# Altium footprint library connectors_socets.pcblib: 601 footprints (part 24 of 38)
Each footprint in its own frame and in the unit in brackets; x right, y up, seen from the top. Pads: shape width x height; smd on the part's side, far side on the other; paste and mask are expansions set on the pad; w line width, h text height; cw(c..) or ccw(c..) is an arc to the next point about the centre after c.
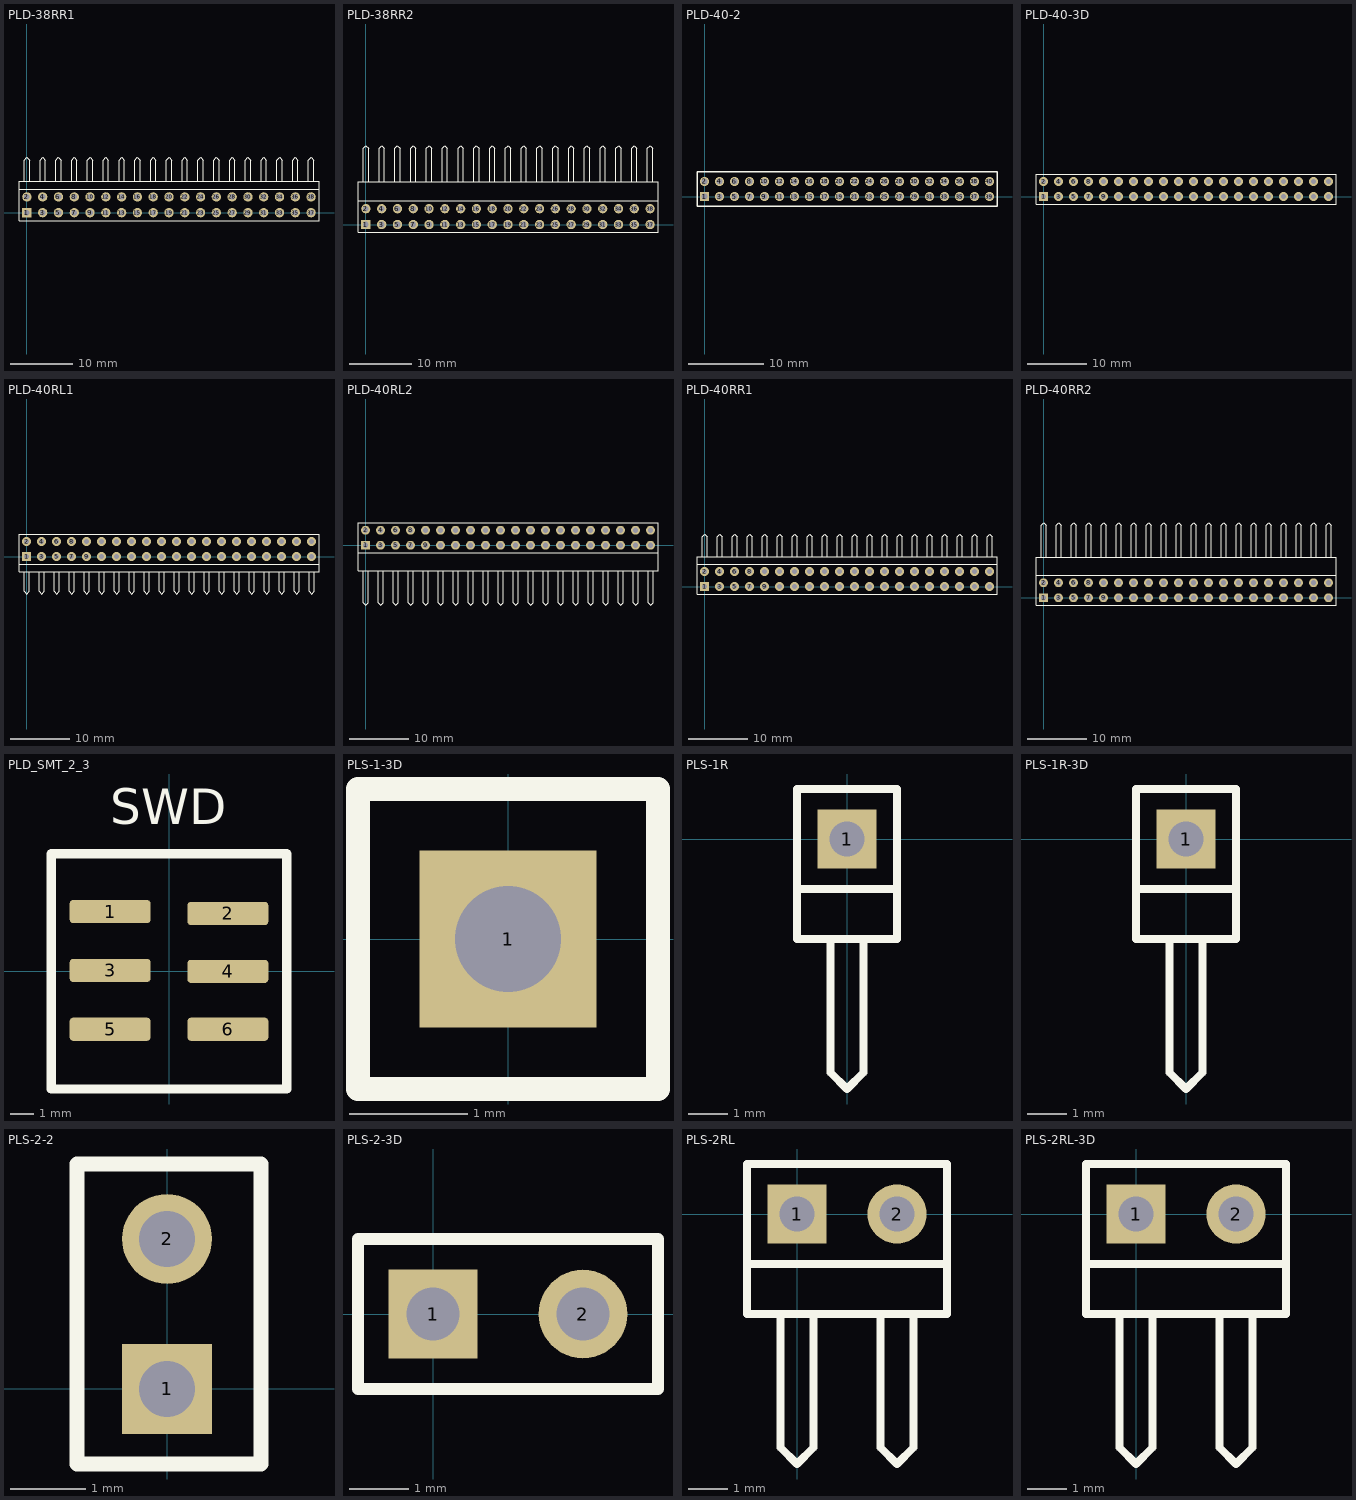
[diagram p23: the footprints below, top view; thin cyan lines are the x and y axes]

## PLD-38RR1 [mm] "Connector; Header; 19x2 Position"
height 7
pads (38):
  rect 1.5x1.5 hole 0.9: 1(0,0)
  round 1.5 hole 0.9: 2(0,2.54) 3(2.54,0) 4(2.54,2.54) 5(5.08,0) 6(5.08,2.54) 7(7.62,0) 8(7.62,2.54) 9(10.16,0) 10(10.16,2.54) 11(12.7,0) 12(12.7,2.54) 13(15.24,0) 14(15.24,2.54) 15(17.78,0) 16(17.78,2.54) 17(20.32,0) 18(20.32,2.54) 19(22.86,0) 20(22.86,2.54) 21(25.4,0) 22(25.4,2.54) 23(27.94,0) 24(27.94,2.54) 25(30.48,0) 26(30.48,2.54) 27(33.02,0) 28(33.02,2.54) 29(35.56,0) 30(35.56,2.54) 31(38.1,0) 32(38.1,2.54) 33(40.64,0) 34(40.64,2.54) 35(43.18,0) 36(43.18,2.54) 37(45.72,0) 38(45.72,2.54)
Top Overlay:
  lines w0.2: -0.423,5.08 -0.423,8.467 0,8.89 0.423,8.467 0.423,5.08 ; 2.117,5.08 2.117,8.467 2.54,8.89 2.963,8.467 2.963,5.08 ; 4.657,5.08 4.657,8.467 5.08,8.89 5.503,8.467 5.503,5.08 ; 7.197,5.08 7.197,8.467 7.62,8.89 8.043,8.467 8.043,5.08 ; 9.737,5.08 9.737,8.467 10.16,8.89 10.583,8.467 10.583,5.08 ; 12.277,5.08 12.277,8.467 12.7,8.89 13.123,8.467 13.123,5.08 ; 14.817,5.08 14.817,8.467 15.24,8.89 15.663,8.467 15.663,5.08 ; 17.357,5.08 17.357,8.467 17.78,8.89 18.203,8.467 18.203,5.08 ; 19.897,5.08 19.897,8.467 20.32,8.89 20.743,8.467 20.743,5.08 ; 22.437,5.08 22.437,8.467 22.86,8.89 23.283,8.467 23.283,5.08 ; 24.977,5.08 24.977,8.467 25.4,8.89 25.823,8.467 25.823,5.08 ; 27.517,5.08 27.517,8.467 27.94,8.89 28.363,8.467 28.363,5.08 ; 30.057,5.08 30.057,8.467 30.48,8.89 30.903,8.467 30.903,5.08 ; 32.597,5.08 32.597,8.467 33.02,8.89 33.443,8.467 33.443,5.08 ; 35.137,5.08 35.137,8.467 35.56,8.89 35.983,8.467 35.983,5.08 ; 37.677,5.08 37.677,8.467 38.1,8.89 38.523,8.467 38.523,5.08 ; 40.217,5.08 40.217,8.467 40.64,8.89 41.063,8.467 41.063,5.08 ; 42.757,5.08 42.757,8.467 43.18,8.89 43.603,8.467 43.603,5.08 ; 45.297,5.08 45.297,8.467 45.72,8.89 46.143,8.467 46.143,5.08 ; -1.27,3.81 46.99,3.81 ; -1.27,3.81 -1.27,-1.27 46.99,-1.27 46.99,3.81 ; -1.27,3.81 -1.27,5.08 46.99,5.08 46.99,3.81
3D body "PLS-1Rr.stp": height 7.99, standoff -3, extent 44.45,-1.27 46.99,9.89
3D body "PLS-1R.step": height 5.45, standoff -3, extent 44.45,1.27 46.99,9.89
3D body "PLS-1R.step": height 5.45, standoff -3, extent 1.27,1.27 3.81,9.89
3D body "PLS-1Rr.stp": height 7.99, standoff -3, extent 1.27,-1.27 3.81,9.89
3D body "PLS-1Rr.stp": height 7.99, standoff -3, extent -1.27,-1.27 1.27,9.89
3D body "PLS-1R.step": height 5.45, standoff -3, extent -1.27,1.27 1.27,9.89
3D body "PLS-1R.step": height 5.45, standoff -3, extent 6.35,1.27 8.89,9.89
3D body "PLS-1Rr.stp": height 7.99, standoff -3, extent 6.35,-1.27 8.89,9.89
3D body "PLS-1Rr.stp": height 7.99, standoff -3, extent 3.81,-1.27 6.35,9.89
3D body "PLS-1R.step": height 5.45, standoff -3, extent 3.81,1.27 6.35,9.89
3D body "PLS-1R.step": height 5.45, standoff -3, extent 11.43,1.27 13.97,9.89
3D body "PLS-1Rr.stp": height 7.99, standoff -3, extent 11.43,-1.27 13.97,9.89
3D body "PLS-1Rr.stp": height 7.99, standoff -3, extent 8.89,-1.27 11.43,9.89
3D body "PLS-1R.step": height 5.45, standoff -3, extent 8.89,1.27 11.43,9.89
3D body "PLS-1R.step": height 5.45, standoff -3, extent 16.51,1.27 19.05,9.89
3D body "PLS-1Rr.stp": height 7.99, standoff -3, extent 16.51,-1.27 19.05,9.89
3D body "PLS-1Rr.stp": height 7.99, standoff -3, extent 13.97,-1.27 16.51,9.89
3D body "PLS-1R.step": height 5.45, standoff -3, extent 13.97,1.27 16.51,9.89
3D body "PLS-1R.step": height 5.45, standoff -3, extent 21.59,1.27 24.13,9.89
3D body "PLS-1Rr.stp": height 7.99, standoff -3, extent 21.59,-1.27 24.13,9.89
3D body "PLS-1Rr.stp": height 7.99, standoff -3, extent 19.05,-1.27 21.59,9.89
3D body "PLS-1R.step": height 5.45, standoff -3, extent 19.05,1.27 21.59,9.89
3D body "PLS-1R.step": height 5.45, standoff -3, extent 26.67,1.27 29.21,9.89
3D body "PLS-1Rr.stp": height 7.99, standoff -3, extent 26.67,-1.27 29.21,9.89
3D body "PLS-1Rr.stp": height 7.99, standoff -3, extent 24.13,-1.27 26.67,9.89
3D body "PLS-1R.step": height 5.45, standoff -3, extent 24.13,1.27 26.67,9.89
3D body "PLS-1R.step": height 5.45, standoff -3, extent 31.75,1.27 34.29,9.89
3D body "PLS-1Rr.stp": height 7.99, standoff -3, extent 31.75,-1.27 34.29,9.89
3D body "PLS-1Rr.stp": height 7.99, standoff -3, extent 29.21,-1.27 31.75,9.89
3D body "PLS-1R.step": height 5.45, standoff -3, extent 29.21,1.27 31.75,9.89
3D body "PLS-1R.step": height 5.45, standoff -3, extent 36.83,1.27 39.37,9.89
3D body "PLS-1Rr.stp": height 7.99, standoff -3, extent 36.83,-1.27 39.37,9.89
3D body "PLS-1Rr.stp": height 7.99, standoff -3, extent 34.29,-1.27 36.83,9.89
3D body "PLS-1R.step": height 5.45, standoff -3, extent 34.29,1.27 36.83,9.89
3D body "PLS-1R.step": height 5.45, standoff -3, extent 41.91,1.27 44.45,9.89
3D body "PLS-1Rr.stp": height 7.99, standoff -3, extent 41.91,-1.27 44.45,9.89
3D body "PLS-1Rr.stp": height 7.99, standoff -3, extent 39.37,-1.27 41.91,9.89
3D body "PLS-1R.step": height 5.45, standoff -3, extent 39.37,1.27 41.91,9.89

## PLD-38RR2 [mm] "Connector; Header; 19x2 Position"
height 5
pads (38):
  rect 1.5x1.5 hole 0.9: 1(0,0)
  round 1.5 hole 0.9: 2(0,2.54) 3(2.54,0) 4(2.54,2.54) 5(5.08,0) 6(5.08,2.54) 7(7.62,0) 8(7.62,2.54) 9(10.16,0) 10(10.16,2.54) 11(12.7,0) 12(12.7,2.54) 13(15.24,0) 14(15.24,2.54) 15(17.78,0) 16(17.78,2.54) 17(20.32,0) 18(20.32,2.54) 19(22.86,0) 20(22.86,2.54) 21(25.4,0) 22(25.4,2.54) 23(27.94,0) 24(27.94,2.54) 25(30.48,0) 26(30.48,2.54) 27(33.02,0) 28(33.02,2.54) 29(35.56,0) 30(35.56,2.54) 31(38.1,0) 32(38.1,2.54) 33(40.64,0) 34(40.64,2.54) 35(43.18,0) 36(43.18,2.54) 37(45.72,0) 38(45.72,2.54)
Top Overlay:
  lines w0.2: -0.423,6.858 -0.423,12.277 0,12.7 0.423,12.277 0.423,6.858 ; 2.117,6.858 2.117,12.277 2.54,12.7 2.963,12.277 2.963,6.858 ; 4.657,6.858 4.657,12.277 5.08,12.7 5.503,12.277 5.503,6.858 ; 7.197,6.858 7.197,12.277 7.62,12.7 8.043,12.277 8.043,6.858 ; 9.737,6.858 9.737,12.277 10.16,12.7 10.583,12.277 10.583,6.858 ; 12.277,6.858 12.277,12.277 12.7,12.7 13.123,12.277 13.123,6.858 ; 14.817,6.858 14.817,12.277 15.24,12.7 15.663,12.277 15.663,6.858 ; 17.357,6.858 17.357,12.277 17.78,12.7 18.203,12.277 18.203,6.858 ; 19.897,6.858 19.897,12.277 20.32,12.7 20.743,12.277 20.743,6.858 ; 22.437,6.858 22.437,12.277 22.86,12.7 23.283,12.277 23.283,6.858 ; 24.977,6.858 24.977,12.277 25.4,12.7 25.823,12.277 25.823,6.858 ; 27.517,6.858 27.517,12.277 27.94,12.7 28.363,12.277 28.363,6.858 ; 30.057,6.858 30.057,12.277 30.48,12.7 30.903,12.277 30.903,6.858 ; 32.597,6.858 32.597,12.277 33.02,12.7 33.443,12.277 33.443,6.858 ; 35.137,6.858 35.137,12.277 35.56,12.7 35.983,12.277 35.983,6.858 ; 37.677,6.858 37.677,12.277 38.1,12.7 38.523,12.277 38.523,6.858 ; 40.217,6.858 40.217,12.277 40.64,12.7 41.063,12.277 41.063,6.858 ; 42.757,6.858 42.757,12.277 43.18,12.7 43.603,12.277 43.603,6.858 ; 45.297,6.858 45.297,12.277 45.72,12.7 46.143,12.277 46.143,6.858 ; 46.99,3.81 -1.27,3.81 ; -1.27,3.81 -1.27,-1.27 46.99,-1.27 46.99,6.858 -1.27,6.858 -1.27,3.81
3D body "PLD-R2.stp": height 5.08, standoff -2.6, extent 3.81,-0.324 6.35,12.516
3D body "PLD-R2.stp": height 5.08, standoff -2.6, extent 1.27,-0.324 3.81,12.516
3D body "PLD-R2.stp": height 5.08, standoff -2.6, extent -1.27,-0.324 1.27,12.516
3D body "PLD-R2.stp": height 5.08, standoff -2.6, extent 11.43,-0.324 13.97,12.516
3D body "PLD-R2.stp": height 5.08, standoff -2.6, extent 8.89,-0.324 11.43,12.516
3D body "PLD-R2.stp": height 5.08, standoff -2.6, extent 6.35,-0.324 8.89,12.516
3D body "PLD-R2.stp": height 5.08, standoff -2.6, extent 19.05,-0.324 21.59,12.516
3D body "PLD-R2.stp": height 5.08, standoff -2.6, extent 16.51,-0.324 19.05,12.516
3D body "PLD-R2.stp": height 5.08, standoff -2.6, extent 13.97,-0.324 16.51,12.516
3D body "PLD-R2.stp": height 5.08, standoff -2.6, extent 26.67,-0.324 29.21,12.516
3D body "PLD-R2.stp": height 5.08, standoff -2.6, extent 24.13,-0.324 26.67,12.516
3D body "PLD-R2.stp": height 5.08, standoff -2.6, extent 21.59,-0.324 24.13,12.516
3D body "PLD-R2.stp": height 5.08, standoff -2.6, extent 34.29,-0.324 36.83,12.516
3D body "PLD-R2.stp": height 5.08, standoff -2.6, extent 31.75,-0.324 34.29,12.516
3D body "PLD-R2.stp": height 5.08, standoff -2.6, extent 29.21,-0.324 31.75,12.516
3D body "PLD-R2.stp": height 5.08, standoff -2.6, extent 41.91,-0.324 44.45,12.516
3D body "PLD-R2.stp": height 5.08, standoff -2.6, extent 39.37,-0.324 41.91,12.516
3D body "PLD-R2.stp": height 5.08, standoff -2.6, extent 36.83,-0.324 39.37,12.516
3D body "PLD-R2.stp": height 5.08, standoff -2.6, extent 44.45,-0.324 46.99,12.516

## PLD-40-2 [mm] "Connector; Header; 20x2 Position"
height 6
pads (40):
  rect 1.2x1.2 hole 0.75: 1(0,0)
  round 1.2 hole 0.75: 2(0,2) 3(2,0) 4(2,2) 5(4,0) 6(4,2) 7(6,0) 8(6,2) 9(8,0) 10(8,2) 11(10,0) 12(10,2) 13(12,0) 14(12,2) 15(14,0) 16(14,2) 17(16,0) 18(16,2) 19(18,0) 20(18,2) 21(20,0) 22(20,2) 23(22,0) 24(22,2) 25(24,0) 26(24,2) 27(26,0) 28(26,2) 29(28,0) 30(28,2) 31(30,0) 32(30,2) 33(32,0) 34(32,2) 35(34,0) 36(34,2) 37(36,0) 38(36,2) 39(38,0) 40(38,2)
Top Overlay:
  lines w0.2: -1,-1.3 -1,3.3 39,3.3 39,-1.3 -1,-1.3
3D body "pld-2mm.stp": height 5.5, standoff -2.5, extent 37,-1.3 39,3.3
3D body "pld-2mm.stp": height 5.5, standoff -2.5, extent 35,-1.3 37,3.3
3D body "pld-2mm.stp": height 5.5, standoff -2.5, extent 33,-1.3 35,3.3
3D body "pld-2mm.stp": height 5.5, standoff -2.5, extent 31,-1.3 33,3.3
3D body "pld-2mm.stp": height 5.5, standoff -2.5, extent 29,-1.3 31,3.3
3D body "pld-2mm.stp": height 5.5, standoff -2.5, extent 27,-1.3 29,3.3
3D body "pld-2mm.stp": height 5.5, standoff -2.5, extent 25,-1.3 27,3.3
3D body "pld-2mm.stp": height 5.5, standoff -2.5, extent 23,-1.3 25,3.3
3D body "pld-2mm.stp": height 5.5, standoff -2.5, extent 21,-1.3 23,3.3
3D body "pld-2mm.stp": height 5.5, standoff -2.5, extent 19,-1.3 21,3.3
3D body "pld-2mm.stp": height 5.5, standoff -2.5, extent 17,-1.3 19,3.3
3D body "pld-2mm.stp": height 5.5, standoff -2.5, extent 15,-1.3 17,3.3
3D body "pld-2mm.stp": height 5.5, standoff -2.5, extent 13,-1.3 15,3.3
3D body "pld-2mm.stp": height 5.5, standoff -2.5, extent 11,-1.3 13,3.3
3D body "pld-2mm.stp": height 5.5, standoff -2.5, extent 9,-1.3 11,3.3
3D body "pld-2mm.stp": height 5.5, standoff -2.5, extent 7,-1.3 9,3.3
3D body "pld-2mm.stp": height 5.5, standoff -2.5, extent 5,-1.3 7,3.3
3D body "pld-2mm.stp": height 5.5, standoff -2.5, extent 3,-1.3 5,3.3
3D body "pld-2mm.stp": height 5.5, standoff -2.5, extent 1,-1.3 3,3.3
3D body "pld-2mm.stp": height 5.5, standoff -2.5, extent -1,-1.3 1,3.3

## PLD-40-3D [mm] "Connector; Header; 20x2 Position"
height 7.5
pads (40):
  rect 1.5x1.5 hole 0.9: 1(0,0)
  round 1.5 hole 0.9: 2(0,2.54) 3(2.54,0) 4(2.54,2.54) 5(5.08,0) 6(5.08,2.54) 7(7.62,0) 8(7.62,2.54) 9(10.16,0) 10(10.16,2.54) 11(12.7,0) 12(12.7,2.54) 13(15.24,0) 14(15.24,2.54) 15(17.78,0) 16(17.78,2.54) 17(20.32,0) 18(20.32,2.54) 19(22.86,0) 20(22.86,2.54) 21(25.4,0) 22(25.4,2.54) 23(27.94,0) 24(27.94,2.54) 25(30.48,0) 26(30.48,2.54) 27(33.02,0) 28(33.02,2.54) 29(35.56,0) 30(35.56,2.54) 31(38.1,0) 32(38.1,2.54) 33(40.64,0) 34(40.64,2.54) 35(43.18,0) 36(43.18,2.54) 37(45.72,0) 38(45.72,2.54) 39(48.26,0) 40(48.26,2.54)
Top Overlay:
  lines w0.2: -1.27,-1.27 49.53,-1.27 49.53,3.81 -1.27,3.81 -1.27,-1.27
3D body "PLD-40.step": height 8.4, standoff -3, extent -1.27,-1.23 49.53,3.77

## PLD-40RL1 [mm] "Connector; Header; 20x2 Position"
height 7
pads (40):
  rect 1.5x1.5 hole 0.9: 1(0,0)
  round 1.5 hole 0.9: 2(0,2.54) 3(2.54,0) 4(2.54,2.54) 5(5.08,0) 6(5.08,2.54) 7(7.62,0) 8(7.62,2.54) 9(10.16,0) 10(10.16,2.54) 11(12.7,0) 12(12.7,2.54) 13(15.24,0) 14(15.24,2.54) 15(17.78,0) 16(17.78,2.54) 17(20.32,0) 18(20.32,2.54) 19(22.86,0) 20(22.86,2.54) 21(25.4,0) 22(25.4,2.54) 23(27.94,0) 24(27.94,2.54) 25(30.48,0) 26(30.48,2.54) 27(33.02,0) 28(33.02,2.54) 29(35.56,0) 30(35.56,2.54) 31(38.1,0) 32(38.1,2.54) 33(40.64,0) 34(40.64,2.54) 35(43.18,0) 36(43.18,2.54) 37(45.72,0) 38(45.72,2.54) 39(48.26,0) 40(48.26,2.54)
Top Overlay:
  lines w0.2: -0.423,-2.54 -0.423,-5.927 0,-6.35 0.423,-5.927 0.423,-2.54 ; 2.117,-2.54 2.117,-5.927 2.54,-6.35 2.963,-5.927 2.963,-2.54 ; 4.657,-2.54 4.657,-5.927 5.08,-6.35 5.503,-5.927 5.503,-2.54 ; 7.197,-2.54 7.197,-5.927 7.62,-6.35 8.043,-5.927 8.043,-2.54 ; 9.737,-2.54 9.737,-5.927 10.16,-6.35 10.583,-5.927 10.583,-2.54 ; 12.277,-2.54 12.277,-5.927 12.7,-6.35 13.123,-5.927 13.123,-2.54 ; 14.817,-2.54 14.817,-5.927 15.24,-6.35 15.663,-5.927 15.663,-2.54 ; 17.357,-2.54 17.357,-5.927 17.78,-6.35 18.203,-5.927 18.203,-2.54 ; 19.897,-2.54 19.897,-5.927 20.32,-6.35 20.743,-5.927 20.743,-2.54 ; 22.437,-2.54 22.437,-5.927 22.86,-6.35 23.283,-5.927 23.283,-2.54 ; 24.977,-2.54 24.977,-5.927 25.4,-6.35 25.823,-5.927 25.823,-2.54 ; 27.517,-2.54 27.517,-5.927 27.94,-6.35 28.363,-5.927 28.363,-2.54 ; 30.057,-2.54 30.057,-5.927 30.48,-6.35 30.903,-5.927 30.903,-2.54 ; 32.597,-2.54 32.597,-5.927 33.02,-6.35 33.443,-5.927 33.443,-2.54 ; 35.137,-2.54 35.137,-5.927 35.56,-6.35 35.983,-5.927 35.983,-2.54 ; 37.677,-2.54 37.677,-5.927 38.1,-6.35 38.523,-5.927 38.523,-2.54 ; 40.217,-2.54 40.217,-5.927 40.64,-6.35 41.063,-5.927 41.063,-2.54 ; 42.757,-2.54 42.757,-5.927 43.18,-6.35 43.603,-5.927 43.603,-2.54 ; 45.297,-2.54 45.297,-5.927 45.72,-6.35 46.143,-5.927 46.143,-2.54 ; 47.837,-2.54 47.837,-5.927 48.26,-6.35 48.683,-5.927 48.683,-2.54 ; -1.27,-1.27 49.53,-1.27 ; -1.27,-1.27 -1.27,3.81 49.53,3.81 49.53,-1.27 ; -1.27,-1.27 -1.27,-2.54 49.53,-2.54 49.53,-1.27
3D body "PLS-1R.step": height 5.45, standoff -3, extent 46.99,-7.35 49.53,1.27
3D body "PLS-1Rr.stp": height 7.99, standoff -3, extent 46.99,-7.35 49.53,3.81
3D body "PLS-1Rr.stp": height 7.99, standoff -3, extent 44.45,-7.35 46.99,3.81
3D body "PLS-1R.step": height 5.45, standoff -3, extent 44.45,-7.35 46.99,1.27
3D body "PLS-1R.step": height 5.45, standoff -3, extent 41.91,-7.35 44.45,1.27
3D body "PLS-1Rr.stp": height 7.99, standoff -3, extent 41.91,-7.35 44.45,3.81
3D body "PLS-1Rr.stp": height 7.99, standoff -3, extent 39.37,-7.35 41.91,3.81
3D body "PLS-1R.step": height 5.45, standoff -3, extent 39.37,-7.35 41.91,1.27
3D body "PLS-1R.step": height 5.45, standoff -3, extent 36.83,-7.35 39.37,1.27
3D body "PLS-1Rr.stp": height 7.99, standoff -3, extent 36.83,-7.35 39.37,3.81
3D body "PLS-1Rr.stp": height 7.99, standoff -3, extent 34.29,-7.35 36.83,3.81
3D body "PLS-1R.step": height 5.45, standoff -3, extent 34.29,-7.35 36.83,1.27
3D body "PLS-1R.step": height 5.45, standoff -3, extent 31.75,-7.35 34.29,1.27
3D body "PLS-1Rr.stp": height 7.99, standoff -3, extent 31.75,-7.35 34.29,3.81
3D body "PLS-1Rr.stp": height 7.99, standoff -3, extent 29.21,-7.35 31.75,3.81
3D body "PLS-1R.step": height 5.45, standoff -3, extent 29.21,-7.35 31.75,1.27
3D body "PLS-1R.step": height 5.45, standoff -3, extent 26.67,-7.35 29.21,1.27
3D body "PLS-1Rr.stp": height 7.99, standoff -3, extent 26.67,-7.35 29.21,3.81
3D body "PLS-1Rr.stp": height 7.99, standoff -3, extent 24.13,-7.35 26.67,3.81
3D body "PLS-1R.step": height 5.45, standoff -3, extent 24.13,-7.35 26.67,1.27
3D body "PLS-1R.step": height 5.45, standoff -3, extent 21.59,-7.35 24.13,1.27
3D body "PLS-1Rr.stp": height 7.99, standoff -3, extent 21.59,-7.35 24.13,3.81
3D body "PLS-1Rr.stp": height 7.99, standoff -3, extent 19.05,-7.35 21.59,3.81
3D body "PLS-1R.step": height 5.45, standoff -3, extent 19.05,-7.35 21.59,1.27
3D body "PLS-1R.step": height 5.45, standoff -3, extent 16.51,-7.35 19.05,1.27
3D body "PLS-1Rr.stp": height 7.99, standoff -3, extent 16.51,-7.35 19.05,3.81
3D body "PLS-1Rr.stp": height 7.99, standoff -3, extent 13.97,-7.35 16.51,3.81
3D body "PLS-1R.step": height 5.45, standoff -3, extent 13.97,-7.35 16.51,1.27
3D body "PLS-1R.step": height 5.45, standoff -3, extent 11.43,-7.35 13.97,1.27
3D body "PLS-1Rr.stp": height 7.99, standoff -3, extent 11.43,-7.35 13.97,3.81
3D body "PLS-1Rr.stp": height 7.99, standoff -3, extent 8.89,-7.35 11.43,3.81
3D body "PLS-1R.step": height 5.45, standoff -3, extent 8.89,-7.35 11.43,1.27
3D body "PLS-1R.step": height 5.45, standoff -3, extent 6.35,-7.35 8.89,1.27
3D body "PLS-1Rr.stp": height 7.99, standoff -3, extent 6.35,-7.35 8.89,3.81
3D body "PLS-1Rr.stp": height 7.99, standoff -3, extent 3.81,-7.35 6.35,3.81
3D body "PLS-1R.step": height 5.45, standoff -3, extent 3.81,-7.35 6.35,1.27
3D body "PLS-1R.step": height 5.45, standoff -3, extent 1.27,-7.35 3.81,1.27
3D body "PLS-1Rr.stp": height 7.99, standoff -3, extent 1.27,-7.35 3.81,3.81
3D body "PLS-1Rr.stp": height 7.99, standoff -3, extent -1.27,-7.35 1.27,3.81
3D body "PLS-1R.step": height 5.45, standoff -3, extent -1.27,-7.35 1.27,1.27

## PLD-40RL2 [mm] "Connector; Header; 20x2 Position"
height 5
pads (40):
  rect 1.5x1.5 hole 0.9: 1(0,0)
  round 1.5 hole 0.9: 2(0,2.54) 3(2.54,0) 4(2.54,2.54) 5(5.08,0) 6(5.08,2.54) 7(7.62,0) 8(7.62,2.54) 9(10.16,0) 10(10.16,2.54) 11(12.7,0) 12(12.7,2.54) 13(15.24,0) 14(15.24,2.54) 15(17.78,0) 16(17.78,2.54) 17(20.32,0) 18(20.32,2.54) 19(22.86,0) 20(22.86,2.54) 21(25.4,0) 22(25.4,2.54) 23(27.94,0) 24(27.94,2.54) 25(30.48,0) 26(30.48,2.54) 27(33.02,0) 28(33.02,2.54) 29(35.56,0) 30(35.56,2.54) 31(38.1,0) 32(38.1,2.54) 33(40.64,0) 34(40.64,2.54) 35(43.18,0) 36(43.18,2.54) 37(45.72,0) 38(45.72,2.54) 39(48.26,0) 40(48.26,2.54)
Top Overlay:
  lines w0.2: -0.423,-4.318 -0.423,-9.737 0,-10.16 0.423,-9.737 0.423,-4.318 ; 2.117,-4.318 2.117,-9.737 2.54,-10.16 2.963,-9.737 2.963,-4.318 ; 4.657,-4.318 4.657,-9.737 5.08,-10.16 5.503,-9.737 5.503,-4.318 ; 7.197,-4.318 7.197,-9.737 7.62,-10.16 8.043,-9.737 8.043,-4.318 ; 9.737,-4.318 9.737,-9.737 10.16,-10.16 10.583,-9.737 10.583,-4.318 ; 12.277,-4.318 12.277,-9.737 12.7,-10.16 13.123,-9.737 13.123,-4.318 ; 14.817,-4.318 14.817,-9.737 15.24,-10.16 15.663,-9.737 15.663,-4.318 ; 17.357,-4.318 17.357,-9.737 17.78,-10.16 18.203,-9.737 18.203,-4.318 ; 19.897,-4.318 19.897,-9.737 20.32,-10.16 20.743,-9.737 20.743,-4.318 ; 22.437,-4.318 22.437,-9.737 22.86,-10.16 23.283,-9.737 23.283,-4.318 ; 24.977,-4.318 24.977,-9.737 25.4,-10.16 25.823,-9.737 25.823,-4.318 ; 27.517,-4.318 27.517,-9.737 27.94,-10.16 28.363,-9.737 28.363,-4.318 ; 30.057,-4.318 30.057,-9.737 30.48,-10.16 30.903,-9.737 30.903,-4.318 ; 32.597,-4.318 32.597,-9.737 33.02,-10.16 33.443,-9.737 33.443,-4.318 ; 35.137,-4.318 35.137,-9.737 35.56,-10.16 35.983,-9.737 35.983,-4.318 ; 37.677,-4.318 37.677,-9.737 38.1,-10.16 38.523,-9.737 38.523,-4.318 ; 40.217,-4.318 40.217,-9.737 40.64,-10.16 41.063,-9.737 41.063,-4.318 ; 42.757,-4.318 42.757,-9.737 43.18,-10.16 43.603,-9.737 43.603,-4.318 ; 45.297,-4.318 45.297,-9.737 45.72,-10.16 46.143,-9.737 46.143,-4.318 ; 47.837,-4.318 47.837,-9.737 48.26,-10.16 48.683,-9.737 48.683,-4.318 ; 49.53,-1.27 -1.27,-1.27 ; -1.27,-1.27 -1.27,3.81 49.53,3.81 49.53,-4.318 -1.27,-4.318 -1.27,-1.27
3D body "PLD-R2.stp": height 5.08, standoff -2.6, extent 3.81,-9.976 6.35,2.864
3D body "PLD-R2.stp": height 5.08, standoff -2.6, extent 1.27,-9.976 3.81,2.864
3D body "PLD-R2.stp": height 5.08, standoff -2.6, extent -1.27,-9.976 1.27,2.864
3D body "PLD-R2.stp": height 5.08, standoff -2.6, extent 11.43,-9.976 13.97,2.864
3D body "PLD-R2.stp": height 5.08, standoff -2.6, extent 8.89,-9.976 11.43,2.864
3D body "PLD-R2.stp": height 5.08, standoff -2.6, extent 6.35,-9.976 8.89,2.864
3D body "PLD-R2.stp": height 5.08, standoff -2.6, extent 19.05,-9.976 21.59,2.864
3D body "PLD-R2.stp": height 5.08, standoff -2.6, extent 16.51,-9.976 19.05,2.864
3D body "PLD-R2.stp": height 5.08, standoff -2.6, extent 13.97,-9.976 16.51,2.864
3D body "PLD-R2.stp": height 5.08, standoff -2.6, extent 26.67,-9.976 29.21,2.864
3D body "PLD-R2.stp": height 5.08, standoff -2.6, extent 24.13,-9.976 26.67,2.864
3D body "PLD-R2.stp": height 5.08, standoff -2.6, extent 21.59,-9.976 24.13,2.864
3D body "PLD-R2.stp": height 5.08, standoff -2.6, extent 34.29,-9.976 36.83,2.864
3D body "PLD-R2.stp": height 5.08, standoff -2.6, extent 31.75,-9.976 34.29,2.864
3D body "PLD-R2.stp": height 5.08, standoff -2.6, extent 29.21,-9.976 31.75,2.864
3D body "PLD-R2.stp": height 5.08, standoff -2.6, extent 41.91,-9.976 44.45,2.864
3D body "PLD-R2.stp": height 5.08, standoff -2.6, extent 39.37,-9.976 41.91,2.864
3D body "PLD-R2.stp": height 5.08, standoff -2.6, extent 36.83,-9.976 39.37,2.864
3D body "PLD-R2.stp": height 5.08, standoff -2.6, extent 44.45,-9.976 46.99,2.864
3D body "PLD-R2.stp": height 5.08, standoff -2.6, extent 46.99,-9.976 49.53,2.864

## PLD-40RR1 [mm] "Connector; Header; 20x2 Position"
height 7
pads (40):
  rect 1.5x1.5 hole 0.9: 1(0,0)
  round 1.5 hole 0.9: 2(0,2.54) 3(2.54,0) 4(2.54,2.54) 5(5.08,0) 6(5.08,2.54) 7(7.62,0) 8(7.62,2.54) 9(10.16,0) 10(10.16,2.54) 11(12.7,0) 12(12.7,2.54) 13(15.24,0) 14(15.24,2.54) 15(17.78,0) 16(17.78,2.54) 17(20.32,0) 18(20.32,2.54) 19(22.86,0) 20(22.86,2.54) 21(25.4,0) 22(25.4,2.54) 23(27.94,0) 24(27.94,2.54) 25(30.48,0) 26(30.48,2.54) 27(33.02,0) 28(33.02,2.54) 29(35.56,0) 30(35.56,2.54) 31(38.1,0) 32(38.1,2.54) 33(40.64,0) 34(40.64,2.54) 35(43.18,0) 36(43.18,2.54) 37(45.72,0) 38(45.72,2.54) 39(48.26,0) 40(48.26,2.54)
Top Overlay:
  lines w0.2: -0.423,5.08 -0.423,8.467 0,8.89 0.423,8.467 0.423,5.08 ; 2.117,5.08 2.117,8.467 2.54,8.89 2.963,8.467 2.963,5.08 ; 4.657,5.08 4.657,8.467 5.08,8.89 5.503,8.467 5.503,5.08 ; 7.197,5.08 7.197,8.467 7.62,8.89 8.043,8.467 8.043,5.08 ; 9.737,5.08 9.737,8.467 10.16,8.89 10.583,8.467 10.583,5.08 ; 12.277,5.08 12.277,8.467 12.7,8.89 13.123,8.467 13.123,5.08 ; 14.817,5.08 14.817,8.467 15.24,8.89 15.663,8.467 15.663,5.08 ; 17.357,5.08 17.357,8.467 17.78,8.89 18.203,8.467 18.203,5.08 ; 19.897,5.08 19.897,8.467 20.32,8.89 20.743,8.467 20.743,5.08 ; 22.437,5.08 22.437,8.467 22.86,8.89 23.283,8.467 23.283,5.08 ; 24.977,5.08 24.977,8.467 25.4,8.89 25.823,8.467 25.823,5.08 ; 27.517,5.08 27.517,8.467 27.94,8.89 28.363,8.467 28.363,5.08 ; 30.057,5.08 30.057,8.467 30.48,8.89 30.903,8.467 30.903,5.08 ; 32.597,5.08 32.597,8.467 33.02,8.89 33.443,8.467 33.443,5.08 ; 35.137,5.08 35.137,8.467 35.56,8.89 35.983,8.467 35.983,5.08 ; 37.677,5.08 37.677,8.467 38.1,8.89 38.523,8.467 38.523,5.08 ; 40.217,5.08 40.217,8.467 40.64,8.89 41.063,8.467 41.063,5.08 ; 42.757,5.08 42.757,8.467 43.18,8.89 43.603,8.467 43.603,5.08 ; 45.297,5.08 45.297,8.467 45.72,8.89 46.143,8.467 46.143,5.08 ; 47.837,5.08 47.837,8.467 48.26,8.89 48.683,8.467 48.683,5.08 ; -1.27,3.81 49.53,3.81 ; -1.27,3.81 -1.27,-1.27 49.53,-1.27 49.53,3.81 ; -1.27,3.81 -1.27,5.08 49.53,5.08 49.53,3.81
3D body "PLS-1R.step": height 5.45, standoff -3, extent 1.27,1.27 3.81,9.89
3D body "PLS-1Rr.stp": height 7.99, standoff -3, extent 1.27,-1.27 3.81,9.89
3D body "PLS-1Rr.stp": height 7.99, standoff -3, extent -1.27,-1.27 1.27,9.89
3D body "PLS-1R.step": height 5.45, standoff -3, extent -1.27,1.27 1.27,9.89
3D body "PLS-1R.step": height 5.45, standoff -3, extent 6.35,1.27 8.89,9.89
3D body "PLS-1Rr.stp": height 7.99, standoff -3, extent 6.35,-1.27 8.89,9.89
3D body "PLS-1Rr.stp": height 7.99, standoff -3, extent 3.81,-1.27 6.35,9.89
3D body "PLS-1R.step": height 5.45, standoff -3, extent 3.81,1.27 6.35,9.89
3D body "PLS-1R.step": height 5.45, standoff -3, extent 11.43,1.27 13.97,9.89
3D body "PLS-1Rr.stp": height 7.99, standoff -3, extent 11.43,-1.27 13.97,9.89
3D body "PLS-1Rr.stp": height 7.99, standoff -3, extent 8.89,-1.27 11.43,9.89
3D body "PLS-1R.step": height 5.45, standoff -3, extent 8.89,1.27 11.43,9.89
3D body "PLS-1R.step": height 5.45, standoff -3, extent 16.51,1.27 19.05,9.89
3D body "PLS-1Rr.stp": height 7.99, standoff -3, extent 16.51,-1.27 19.05,9.89
3D body "PLS-1Rr.stp": height 7.99, standoff -3, extent 13.97,-1.27 16.51,9.89
3D body "PLS-1R.step": height 5.45, standoff -3, extent 13.97,1.27 16.51,9.89
3D body "PLS-1R.step": height 5.45, standoff -3, extent 21.59,1.27 24.13,9.89
3D body "PLS-1Rr.stp": height 7.99, standoff -3, extent 21.59,-1.27 24.13,9.89
3D body "PLS-1Rr.stp": height 7.99, standoff -3, extent 19.05,-1.27 21.59,9.89
3D body "PLS-1R.step": height 5.45, standoff -3, extent 19.05,1.27 21.59,9.89
3D body "PLS-1R.step": height 5.45, standoff -3, extent 26.67,1.27 29.21,9.89
3D body "PLS-1Rr.stp": height 7.99, standoff -3, extent 26.67,-1.27 29.21,9.89
3D body "PLS-1Rr.stp": height 7.99, standoff -3, extent 24.13,-1.27 26.67,9.89
3D body "PLS-1R.step": height 5.45, standoff -3, extent 24.13,1.27 26.67,9.89
3D body "PLS-1R.step": height 5.45, standoff -3, extent 31.75,1.27 34.29,9.89
3D body "PLS-1Rr.stp": height 7.99, standoff -3, extent 31.75,-1.27 34.29,9.89
3D body "PLS-1Rr.stp": height 7.99, standoff -3, extent 29.21,-1.27 31.75,9.89
3D body "PLS-1R.step": height 5.45, standoff -3, extent 29.21,1.27 31.75,9.89
3D body "PLS-1R.step": height 5.45, standoff -3, extent 36.83,1.27 39.37,9.89
3D body "PLS-1Rr.stp": height 7.99, standoff -3, extent 36.83,-1.27 39.37,9.89
3D body "PLS-1Rr.stp": height 7.99, standoff -3, extent 34.29,-1.27 36.83,9.89
3D body "PLS-1R.step": height 5.45, standoff -3, extent 34.29,1.27 36.83,9.89
3D body "PLS-1R.step": height 5.45, standoff -3, extent 41.91,1.27 44.45,9.89
3D body "PLS-1Rr.stp": height 7.99, standoff -3, extent 41.91,-1.27 44.45,9.89
3D body "PLS-1Rr.stp": height 7.99, standoff -3, extent 39.37,-1.27 41.91,9.89
3D body "PLS-1R.step": height 5.45, standoff -3, extent 39.37,1.27 41.91,9.89
3D body "PLS-1R.step": height 5.45, standoff -3, extent 46.99,1.27 49.53,9.89
3D body "PLS-1Rr.stp": height 7.99, standoff -3, extent 46.99,-1.27 49.53,9.89
3D body "PLS-1Rr.stp": height 7.99, standoff -3, extent 44.45,-1.27 46.99,9.89
3D body "PLS-1R.step": height 5.45, standoff -3, extent 44.45,1.27 46.99,9.89

## PLD-40RR2 [mm] "Connector; Header; 20x2 Position"
height 5
pads (40):
  rect 1.5x1.5 hole 0.9: 1(0,0)
  round 1.5 hole 0.9: 2(0,2.54) 3(2.54,0) 4(2.54,2.54) 5(5.08,0) 6(5.08,2.54) 7(7.62,0) 8(7.62,2.54) 9(10.16,0) 10(10.16,2.54) 11(12.7,0) 12(12.7,2.54) 13(15.24,0) 14(15.24,2.54) 15(17.78,0) 16(17.78,2.54) 17(20.32,0) 18(20.32,2.54) 19(22.86,0) 20(22.86,2.54) 21(25.4,0) 22(25.4,2.54) 23(27.94,0) 24(27.94,2.54) 25(30.48,0) 26(30.48,2.54) 27(33.02,0) 28(33.02,2.54) 29(35.56,0) 30(35.56,2.54) 31(38.1,0) 32(38.1,2.54) 33(40.64,0) 34(40.64,2.54) 35(43.18,0) 36(43.18,2.54) 37(45.72,0) 38(45.72,2.54) 39(48.26,0) 40(48.26,2.54)
Top Overlay:
  lines w0.2: -0.423,6.858 -0.423,12.277 0,12.7 0.423,12.277 0.423,6.858 ; 2.117,6.858 2.117,12.277 2.54,12.7 2.963,12.277 2.963,6.858 ; 4.657,6.858 4.657,12.277 5.08,12.7 5.503,12.277 5.503,6.858 ; 7.197,6.858 7.197,12.277 7.62,12.7 8.043,12.277 8.043,6.858 ; 9.737,6.858 9.737,12.277 10.16,12.7 10.583,12.277 10.583,6.858 ; 12.277,6.858 12.277,12.277 12.7,12.7 13.123,12.277 13.123,6.858 ; 14.817,6.858 14.817,12.277 15.24,12.7 15.663,12.277 15.663,6.858 ; 17.357,6.858 17.357,12.277 17.78,12.7 18.203,12.277 18.203,6.858 ; 19.897,6.858 19.897,12.277 20.32,12.7 20.743,12.277 20.743,6.858 ; 22.437,6.858 22.437,12.277 22.86,12.7 23.283,12.277 23.283,6.858 ; 24.977,6.858 24.977,12.277 25.4,12.7 25.823,12.277 25.823,6.858 ; 27.517,6.858 27.517,12.277 27.94,12.7 28.363,12.277 28.363,6.858 ; 30.057,6.858 30.057,12.277 30.48,12.7 30.903,12.277 30.903,6.858 ; 32.597,6.858 32.597,12.277 33.02,12.7 33.443,12.277 33.443,6.858 ; 35.137,6.858 35.137,12.277 35.56,12.7 35.983,12.277 35.983,6.858 ; 37.677,6.858 37.677,12.277 38.1,12.7 38.523,12.277 38.523,6.858 ; 40.217,6.858 40.217,12.277 40.64,12.7 41.063,12.277 41.063,6.858 ; 42.757,6.858 42.757,12.277 43.18,12.7 43.603,12.277 43.603,6.858 ; 45.297,6.858 45.297,12.277 45.72,12.7 46.143,12.277 46.143,6.858 ; 47.837,6.858 47.837,12.277 48.26,12.7 48.683,12.277 48.683,6.858 ; 49.53,3.81 -1.27,3.81 ; -1.27,3.81 -1.27,6.858 49.53,6.858 49.53,-1.27 -1.27,-1.27 -1.27,3.81
3D body "PLD-R2.stp": height 5.08, standoff -2.6, extent 46.99,-0.324 49.53,12.516
3D body "PLD-R2.stp": height 5.08, standoff -2.6, extent 44.45,-0.324 46.99,12.516
3D body "PLD-R2.stp": height 5.08, standoff -2.6, extent 36.83,-0.324 39.37,12.516
3D body "PLD-R2.stp": height 5.08, standoff -2.6, extent 39.37,-0.324 41.91,12.516
3D body "PLD-R2.stp": height 5.08, standoff -2.6, extent 41.91,-0.324 44.45,12.516
3D body "PLD-R2.stp": height 5.08, standoff -2.6, extent 29.21,-0.324 31.75,12.516
3D body "PLD-R2.stp": height 5.08, standoff -2.6, extent 31.75,-0.324 34.29,12.516
3D body "PLD-R2.stp": height 5.08, standoff -2.6, extent 34.29,-0.324 36.83,12.516
3D body "PLD-R2.stp": height 5.08, standoff -2.6, extent 21.59,-0.324 24.13,12.516
3D body "PLD-R2.stp": height 5.08, standoff -2.6, extent 24.13,-0.324 26.67,12.516
3D body "PLD-R2.stp": height 5.08, standoff -2.6, extent 26.67,-0.324 29.21,12.516
3D body "PLD-R2.stp": height 5.08, standoff -2.6, extent 13.97,-0.324 16.51,12.516
3D body "PLD-R2.stp": height 5.08, standoff -2.6, extent 16.51,-0.324 19.05,12.516
3D body "PLD-R2.stp": height 5.08, standoff -2.6, extent 19.05,-0.324 21.59,12.516
3D body "PLD-R2.stp": height 5.08, standoff -2.6, extent 6.35,-0.324 8.89,12.516
3D body "PLD-R2.stp": height 5.08, standoff -2.6, extent 8.89,-0.324 11.43,12.516
3D body "PLD-R2.stp": height 5.08, standoff -2.6, extent 11.43,-0.324 13.97,12.516
3D body "PLD-R2.stp": height 5.08, standoff -2.6, extent -1.27,-0.324 1.27,12.516
3D body "PLD-R2.stp": height 5.08, standoff -2.6, extent 1.27,-0.324 3.81,12.516
3D body "PLD-R2.stp": height 5.08, standoff -2.6, extent 3.81,-0.324 6.35,12.516

## PLD_SMT_2_3 [mm]
pads (6):
  rrect30% 3.5x1 smd: 1(-2.54,2.58) 2(2.54,2.5) 3(-2.54,0.04) 4(2.54,0) 5(-2.54,-2.5) 6(2.54,-2.5)
Top Overlay:
  lines w0.4: -5.08,-5.08 -5.08,5.08 5.08,5.08 5.08,-5.08 -5.08,-5.08
  text "SWD" at -2.54,6.35 h1.52
3D body "SW3dPS-Molex - 15-91-0100 (Pin Header 2.54mm 10 Pin).stp": height 9.66, standoff 0, extent -3.5,-3.81 3.5,3.81

## PLS-1-3D [mm] "Connector; Header; 1 Position"
height 7.5
pads (1):
  rect 1.5x1.5 hole 0.9: 1(0,0)
Top Overlay:
  lines w0.2: -1.27,-1.27 -1.27,1.27 1.27,1.27 1.27,-1.27 -1.27,-1.27
3D body "PLS-1.step": height 8.44, standoff -3, extent -1.27,-1.27 1.27,1.27

## PLS-1R [mm] "Connector; Header; 1 Position; Right Angle"
height 0.001
pads (1):
  rect 1.5x1.5 hole 0.9: 1(0,0)
Top Overlay:
  lines w0.2: -0.423,-2.54 -0.423,-5.927 0,-6.35 0.423,-5.927 0.423,-2.54 ; -1.27,-1.27 -1.27,1.27 1.27,1.27 1.27,-1.27 ; -1.27,-1.27 -1.27,-2.54 1.27,-2.54 1.27,-1.27 ; -1.27,-1.27 1.27,-1.27

## PLS-1R-3D [mm] "Connector; Header; 1 Position; Right Angle"
height 12
pads (1):
  rect 1.5x1.5 hole 0.9: 1(0,0)
Top Overlay:
  lines w0.2: -0.423,-2.54 -0.423,-5.927 0,-6.35 0.423,-5.927 0.423,-2.54 ; -1.27,-1.27 1.27,-1.27 ; -1.27,-1.27 -1.27,-2.54 1.27,-2.54 1.27,-1.27 ; -1.27,-1.27 -1.27,1.27 1.27,1.27 1.27,-1.27
3D body "PLS-1R.step": height 5.45, standoff -3, extent -1.27,-7.35 1.27,1.27

## PLS-2-2 [mm] "Connector; Header; 1x2 Position"
height 6
pads (2):
  rect 1.2x1.2 hole 0.75: 1(0,0)
  round 1.2 hole 0.75: 2(0,2)
Top Overlay:
  lines w0.2: -1.2,-1 1.25,-1 1.25,3 -1.2,3 -1.2,-1
3D body "pls-2mm.stp": height 5.5, standoff -2.5, extent -1.2,1 1.2,3
3D body "pls-2mm.stp": height 5.5, standoff -2.5, extent -1.2,-1 1.2,1

## PLS-2-3D [mm] "Connector; Header; 2 Position"
height 7.5
pads (2):
  rect 1.5x1.5 hole 0.9: 1(0,0)
  round 1.5 hole 0.9: 2(2.54,0)
Top Overlay:
  lines w0.2: -1.27,-1.27 3.81,-1.27 3.81,1.27 -1.27,1.27 -1.27,-1.27
3D body "PLS-1.step": height 8.44, standoff -3, extent -1.27,-1.27 1.27,1.27
3D body "PLS-1.step": height 8.44, standoff -3, extent 1.27,-1.27 3.81,1.27

## PLS-2RL [mm] "Connector; Header; 2 Position; Right Angle"
pads (2):
  rect 1.5x1.5 hole 0.9: 1(0,0)
  round 1.5 hole 0.9: 2(2.54,0)
Top Overlay:
  lines w0.2: -0.423,-2.54 -0.423,-5.927 0,-6.35 0.423,-5.927 0.423,-2.54 ; 2.117,-2.54 2.117,-5.927 2.54,-6.35 2.963,-5.927 2.963,-2.54 ; 3.81,-1.27 -1.27,-1.27 ; -1.27,-2.54 -1.27,1.27 ; -1.27,-2.54 3.81,-2.54 3.81,1.27 -1.27,1.27 ; -1.27,-2.54 -1.27,-1.27 ; -1.27,-1.27 -1.27,1.27

## PLS-2RL-3D [mm] "Connector; Header; 2 Position; Right Angle"
height 12
pads (2):
  rect 1.5x1.5 hole 0.9: 1(0,0)
  round 1.5 hole 0.9: 2(2.54,0)
Top Overlay:
  lines w0.2: -0.423,-2.54 -0.423,-5.927 0,-6.35 0.423,-5.927 0.423,-2.54 ; 2.117,-2.54 2.117,-5.927 2.54,-6.35 2.963,-5.927 2.963,-2.54 ; 3.81,-1.27 -1.27,-1.27 ; -1.27,-2.54 -1.27,-1.27 ; -1.27,-2.54 3.81,-2.54 3.81,1.27 -1.27,1.27 ; -1.27,-2.54 -1.27,1.27 ; -1.27,-1.27 -1.27,1.27
3D body "PLS-1R.step": height 5.45, standoff -3, extent 1.27,-7.35 3.81,1.27
3D body "PLS-1R.step": height 5.45, standoff -3, extent -1.27,-7.35 1.27,1.27